# Altium schematic symbol library jlcpcb_2025_04_inductors_extended_0402.schlib: 1396 symbols (part 7 of 8) (continued)
## SDWL1005C82NJSTF
designator L?  Inductance: 82nH
Inductor, 82nH, ±5%, 1.9Ω, 140mA, SMD 0402; Manufacturer: Sunlord; Manufacturer Part Number: SDWL1005C82NJSTF; Package Size: 0402; JLCPCB Basic Part: No; JLCPCB Part Number: C54972; Supplier 1: LCSC; Category: Inductors; Supplier Part Number 1: C54972; Tolerance: ±5%; Rated Current: 140mA; DC Resistance: 1.9Ω; RoHS: Yes; ComponentLink1Description: Datasheet; ComponentLink1URL: https://wmsc.lcsc.com/wmsc/upload/file/pdf/v2/lcsc/2304140030_Sunlord-SDWL1005C82NJSTF_C54972.pdf; ComponentLink2Description: JLCPCB Part URL; ComponentLink2URL: https://jlcpcb.com/partdetail/C54972; ComponentLink3Description: LCSC Part URL; ComponentLink3URL: https://lcsc.com/product-detail/Inductors-SMD_Sunlord-Sunlord-SDWL1005C82NJSTF_C54972.html
footprint IND-0402 (0402 (1005M) Inductor)
pins: 1, 2

## SDWL1005C82NJSTFM01
designator L?  Inductance: 82nH
Inductor, 82nH, ±5%, 2.24Ω, 130mA, SMD 0402; Manufacturer: Sunlord; Manufacturer Part Number: SDWL1005C82NJSTFM01; Package Size: 0402; JLCPCB Basic Part: No; JLCPCB Part Number: C408710; Supplier 1: LCSC; Category: Inductors; Supplier Part Number 1: C408710; Tolerance: ±5%; Rated Current: 130mA; DC Resistance: 2.24Ω; RoHS: Yes; ComponentLink1Description: Datasheet; ComponentLink1URL: https://wmsc.lcsc.com/wmsc/upload/file/pdf/v2/lcsc/2304140030_Sunlord-SDWL1005C82NJSTFM01_C408710.pdf; ComponentLink2Description: JLCPCB Part URL; ComponentLink2URL: https://jlcpcb.com/partdetail/C408710; ComponentLink3Description: LCSC Part URL; ComponentLink3URL: https://lcsc.com/product-detail/Inductors-SMD_Sunlord-Sunlord-SDWL1005C82NJSTFM01_C408710.html
footprint IND-0402 (0402 (1005M) Inductor)
pins: 1, 2

## SDWL1005CHR10GSTF
designator L?  Inductance: 100nH
Inductor, 100nH, ±2%, 1.2Ω, 310mA, SMD 0402; Manufacturer: Sunlord; Manufacturer Part Number: SDWL1005CHR10GSTF; Package Size: 0402; JLCPCB Basic Part: No; JLCPCB Part Number: C370317; Supplier 1: LCSC; Category: Inductors; Supplier Part Number 1: C370317; Tolerance: ±2%; Rated Current: 310mA; DC Resistance: 1.2Ω; RoHS: Yes; ComponentLink1Description: Datasheet; ComponentLink1URL: https://wmsc.lcsc.com/wmsc/upload/file/pdf/v2/lcsc/2304140030_Sunlord-SDWL1005CHR10GSTF_C370317.pdf; ComponentLink2Description: JLCPCB Part URL; ComponentLink2URL: https://jlcpcb.com/partdetail/C370317; ComponentLink3Description: LCSC Part URL; ComponentLink3URL: https://lcsc.com/product-detail/Inductors-SMD_Sunlord-Sunlord-SDWL1005CHR10GSTF_C370317.html
footprint IND-0402 (0402 (1005M) Inductor)
pins: 1, 2

## SDWL1005CP3N6CSTF
designator L?  Inductance: 3.6nH
Inductor, 3.6nH, 45mΩ, 1.7A, SMD 0402; Manufacturer: Sunlord; Manufacturer Part Number: SDWL1005CP3N6CSTF; Package Size: 0402; JLCPCB Basic Part: No; JLCPCB Part Number: C370319; Supplier 1: LCSC; Category: Inductors; Supplier Part Number 1: C370319; Rated Current: 1.7A; DC Resistance: 45mΩ; RoHS: Yes; ComponentLink1Description: Datasheet; ComponentLink1URL: https://wmsc.lcsc.com/wmsc/upload/file/pdf/v2/lcsc/2304140030_Sunlord-SDWL1005CP3N6CSTF_C370319.pdf; ComponentLink2Description: JLCPCB Part URL; ComponentLink2URL: https://jlcpcb.com/partdetail/C370319; ComponentLink3Description: LCSC Part URL; ComponentLink3URL: https://lcsc.com/product-detail/Inductors-SMD_Sunlord-Sunlord-SDWL1005CP3N6CSTF_C370319.html
footprint IND-0402 (0402 (1005M) Inductor)
pins: 1, 2

## SDWL1005CP18NJSTF
designator L?  Inductance: 18nH
Inductor, 18nH, ±5%, 120mΩ, 900mA, SMD 0402; Manufacturer: Sunlord; Manufacturer Part Number: SDWL1005CP18NJSTF; Package Size: 0402; JLCPCB Basic Part: No; JLCPCB Part Number: C361613; Supplier 1: LCSC; Category: Inductors; Supplier Part Number 1: C361613; Tolerance: ±5%; Rated Current: 900mA; DC Resistance: 120mΩ; RoHS: Yes; ComponentLink1Description: Datasheet; ComponentLink1URL: https://wmsc.lcsc.com/wmsc/upload/file/pdf/v2/lcsc/2304140030_Sunlord-SDWL1005CP18NJSTF_C361613.pdf; ComponentLink2Description: JLCPCB Part URL; ComponentLink2URL: https://jlcpcb.com/partdetail/C361613; ComponentLink3Description: LCSC Part URL; ComponentLink3URL: https://lcsc.com/product-detail/Inductors-SMD_Sunlord-Sunlord-SDWL1005CP18NJSTF_C361613.html
footprint IND-0402 (0402 (1005M) Inductor)
pins: 1, 2

## SDWL1005CP33NJSTF
designator L?  Inductance: 33nH
Inductor, 33nH, ±5%, 330mΩ, 490mA, SMD 0402; Manufacturer: Sunlord; Manufacturer Part Number: SDWL1005CP33NJSTF; Package Size: 0402; JLCPCB Basic Part: No; JLCPCB Part Number: C361611; Supplier 1: LCSC; Category: Inductors; Supplier Part Number 1: C361611; Tolerance: ±5%; Rated Current: 490mA; DC Resistance: 330mΩ; RoHS: Yes; ComponentLink1Description: Datasheet; ComponentLink1URL: https://wmsc.lcsc.com/wmsc/upload/file/pdf/v2/lcsc/2304140030_Sunlord-SDWL1005CP33NJSTF_C361611.pdf; ComponentLink2Description: JLCPCB Part URL; ComponentLink2URL: https://jlcpcb.com/partdetail/C361611; ComponentLink3Description: LCSC Part URL; ComponentLink3URL: https://lcsc.com/product-detail/Inductors-SMD_Sunlord-Sunlord-SDWL1005CP33NJSTF_C361611.html
footprint IND-0402 (0402 (1005M) Inductor)
pins: 1, 2

## SDWL1005CP39NJSTF
designator L?  Inductance: 39nH
Inductor, 39nH, ±5%, 430mΩ, 450mA, SMD 0402; Manufacturer: Sunlord; Manufacturer Part Number: SDWL1005CP39NJSTF; Package Size: 0402; JLCPCB Basic Part: No; JLCPCB Part Number: C361610; Supplier 1: LCSC; Category: Inductors; Supplier Part Number 1: C361610; Tolerance: ±5%; Rated Current: 450mA; DC Resistance: 430mΩ; RoHS: Yes; ComponentLink1Description: Datasheet; ComponentLink1URL: https://wmsc.lcsc.com/wmsc/upload/file/pdf/v2/lcsc/2008271805_Sunlord-SDWL1005CP39NJSTF_C361610.pdf; ComponentLink2Description: JLCPCB Part URL; ComponentLink2URL: https://jlcpcb.com/partdetail/C361610; ComponentLink3Description: LCSC Part URL; ComponentLink3URL: https://lcsc.com/product-detail/Inductors-SMD_Sunlord-Sunlord-SDWL1005CP39NJSTF_C361610.html
footprint IND-0402 (0402 (1005M) Inductor)
pins: 1, 2

## SDWL1005CR10GSTF
designator L?  Inductance: 100nH
Inductor, 100nH, ±2%, 2.06Ω, 130mA, SMD 0402; Manufacturer: Sunlord; Manufacturer Part Number: SDWL1005CR10GSTF; Package Size: 0402; JLCPCB Basic Part: No; JLCPCB Part Number: C95949; Supplier 1: LCSC; Category: Inductors; Supplier Part Number 1: C95949; Tolerance: ±2%; Rated Current: 130mA; DC Resistance: 2.06Ω; RoHS: Yes; ComponentLink1Description: Datasheet; ComponentLink1URL: https://wmsc.lcsc.com/wmsc/upload/file/pdf/v2/lcsc/2304140030_Sunlord-SDWL1005CR10GSTF_C95949.pdf; ComponentLink2Description: JLCPCB Part URL; ComponentLink2URL: https://jlcpcb.com/partdetail/C95949; ComponentLink3Description: LCSC Part URL; ComponentLink3URL: https://lcsc.com/product-detail/Inductors-SMD_Sunlord-Sunlord-SDWL1005CR10GSTF_C95949.html
footprint IND-0402 (0402 (1005M) Inductor)
pins: 1, 2

## SDWL1005CR10JSTF
designator L?  Inductance: 100nH
Inductor, 100nH, ±5%, 2.06Ω, 130mA, SMD 0402; Manufacturer: Sunlord; Manufacturer Part Number: SDWL1005CR10JSTF; Package Size: 0402; JLCPCB Basic Part: No; JLCPCB Part Number: C54977; Supplier 1: LCSC; Category: Inductors; Supplier Part Number 1: C54977; Tolerance: ±5%; Rated Current: 130mA; DC Resistance: 2.06Ω; RoHS: Yes; ComponentLink1Description: Datasheet; ComponentLink1URL: https://wmsc.lcsc.com/wmsc/upload/file/pdf/v2/lcsc/2304140030_Sunlord-SDWL1005CR10JSTF_C54977.pdf; ComponentLink2Description: JLCPCB Part URL; ComponentLink2URL: https://jlcpcb.com/partdetail/C54977; ComponentLink3Description: LCSC Part URL; ComponentLink3URL: https://lcsc.com/product-detail/Inductors-SMD_Sunlord-Sunlord-SDWL1005CR10JSTF_C54977.html
footprint IND-0402 (0402 (1005M) Inductor)
pins: 1, 2

## SDWL1005CR12JSTFM01
designator L?  Inductance: 120nH
Inductor, 120nH, ±5%, 2.66Ω, 110mA, SMD 0402; Manufacturer: Sunlord; Manufacturer Part Number: SDWL1005CR12JSTFM01; Package Size: 0402; JLCPCB Basic Part: No; JLCPCB Part Number: C408712; Supplier 1: LCSC; Category: Inductors; Supplier Part Number 1: C408712; Tolerance: ±5%; Rated Current: 110mA; DC Resistance: 2.66Ω; RoHS: Yes; ComponentLink1Description: Datasheet; ComponentLink1URL: https://wmsc.lcsc.com/wmsc/upload/file/pdf/v2/lcsc/1912111437_Sunlord-SDWL1005CR12JSTFM01_C408712.pdf; ComponentLink2Description: JLCPCB Part URL; ComponentLink2URL: https://jlcpcb.com/partdetail/C408712; ComponentLink3Description: LCSC Part URL; ComponentLink3URL: https://lcsc.com/product-detail/Inductors-SMD_Sunlord-Sunlord-SDWL1005CR12JSTFM01_C408712.html
footprint IND-0402 (0402 (1005M) Inductor)
pins: 1, 2

## VHF100505H1N0ST
designator L?  Inductance: 1nH
Inductor, 1nH, 100mΩ, 400mA, SMD 0402; Manufacturer: FH (Guangdong Fenghua Advanced Tech); Manufacturer Part Number: VHF100505H1N0ST; Self-Resonant Frequency: 10GHz; Q Factor: 8@100MHz; Package Size: 0402; JLCPCB Basic Part: No; JLCPCB Part Number: C2840281; Supplier 1: LCSC; Category: Inductors; Supplier Part Number 1: C2840281; Rated Current: 400mA; DC Resistance: 100mΩ; RoHS: Yes; ComponentLink1Description: Datasheet; ComponentLink1URL: https://wmsc.lcsc.com/wmsc/upload/file/pdf/v2/lcsc/2202132000_FH--Guangdong-Fenghua-Advanced-Tech-VHF100505H1N0ST_C2840281.pdf; ComponentLink2Description: JLCPCB Part URL; ComponentLink2URL: https://jlcpcb.com/partdetail/C2840281; ComponentLink3Description: LCSC Part URL; ComponentLink3URL: https://lcsc.com/product-detail/Inductors-SMD_FH-Guangdong-Fenghua-Advanced-Tech-FH-Guangdong-Fenghua-Advanced-Tech-VHF100505H1N0ST_C2840281.html
footprint IND-0402 (0402 (1005M) Inductor)
pins: 1, 2

## VHF100505H1N1ST
designator L?  Inductance: 1.1nH
Inductor, 1.1nH, 400mΩ, 300mA, SMD 0402; Manufacturer: FH(Guangdong Fenghua Advanced Tech); Manufacturer Part Number: VHF100505H1N1ST; Package Size: 0402; JLCPCB Basic Part: No; JLCPCB Part Number: C381799; Supplier 1: LCSC; Category: Inductors; Supplier Part Number 1: C381799; Rated Current: 300mA; DC Resistance: 400mΩ; RoHS: Yes; ComponentLink1Description: Datasheet; ComponentLink1URL: https://wmsc.lcsc.com/wmsc/upload/file/pdf/v2/lcsc/2304140030_FH--Guangdong-Fenghua-Advanced-Tech-VHF100505H1N1ST_C381799.pdf; ComponentLink2Description: JLCPCB Part URL; ComponentLink2URL: https://jlcpcb.com/partdetail/C381799; ComponentLink3Description: LCSC Part URL; ComponentLink3URL: https://lcsc.com/product-detail/Inductors-SMD_FH-Guangdong-Fenghua-Advanced-Tech-FH-Guangdong-Fenghua-Advanced-Tech-VHF100505H1N1ST_C381799.html
footprint IND-0402 (0402 (1005M) Inductor)
pins: 1, 2

## VHF100505H1N2ST
designator L?  Inductance: 1.2nH
Inductor, 1.2nH, 170mΩ, 300mA, SMD 0402; Manufacturer: FH(Guangdong Fenghua Advanced Tech); Manufacturer Part Number: VHF100505H1N2ST; Package Size: 0402; JLCPCB Basic Part: No; JLCPCB Part Number: C90187; Supplier 1: LCSC; Category: Inductors; Supplier Part Number 1: C90187; Rated Current: 300mA; DC Resistance: 170mΩ; RoHS: Yes; ComponentLink1Description: Datasheet; ComponentLink1URL: https://wmsc.lcsc.com/wmsc/upload/file/pdf/v2/lcsc/2304140030_FH--Guangdong-Fenghua-Advanced-Tech-VHF100505H1N2ST_C90187.pdf; ComponentLink2Description: JLCPCB Part URL; ComponentLink2URL: https://jlcpcb.com/partdetail/C90187; ComponentLink3Description: LCSC Part URL; ComponentLink3URL: https://lcsc.com/product-detail/Inductors-SMD_FH-Guangdong-Fenghua-Advanced-Tech-FH-Guangdong-Fenghua-Advanced-Tech-VHF100505H1N2ST_C90187.html
footprint IND-0402 (0402 (1005M) Inductor)
pins: 1, 2

## VHF100505H1N3ST
designator L?  Inductance: 1.3nH
Inductor, 1.3nH, 400mΩ, 300mA, SMD 0402; Manufacturer: FH(Guangdong Fenghua Advanced Tech); Manufacturer Part Number: VHF100505H1N3ST; Package Size: 0402; JLCPCB Basic Part: No; JLCPCB Part Number: C381800; Supplier 1: LCSC; Category: Inductors; Supplier Part Number 1: C381800; Rated Current: 300mA; DC Resistance: 400mΩ; RoHS: Yes; ComponentLink1Description: Datasheet; ComponentLink1URL: https://wmsc.lcsc.com/wmsc/upload/file/pdf/v2/lcsc/2304140030_FH--Guangdong-Fenghua-Advanced-Tech-VHF100505H1N3ST_C381800.pdf; ComponentLink2Description: JLCPCB Part URL; ComponentLink2URL: https://jlcpcb.com/partdetail/C381800; ComponentLink3Description: LCSC Part URL; ComponentLink3URL: https://lcsc.com/product-detail/Inductors-SMD_FH-Guangdong-Fenghua-Advanced-Tech-FH-Guangdong-Fenghua-Advanced-Tech-VHF100505H1N3ST_C381800.html
footprint IND-0402 (0402 (1005M) Inductor)
pins: 1, 2

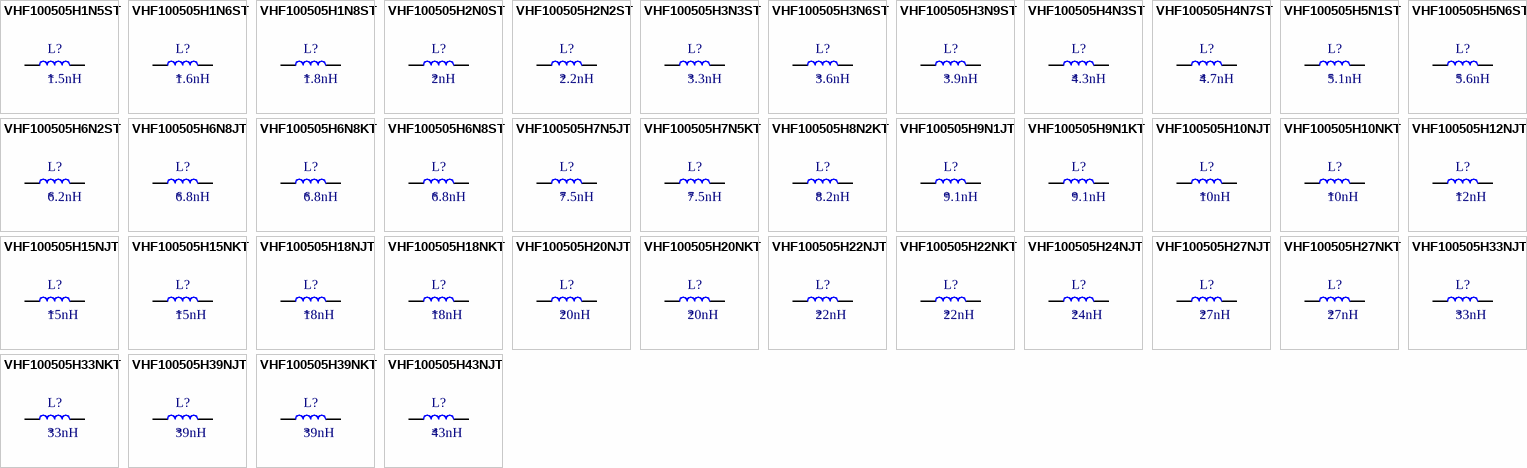
[diagram p32: symbols VHF100505H1N5ST to VHF100505H43NJT]

## VHF100505H1N5ST
designator L?  Inductance: 1.5nH
Inductor, 1.5nH, 180mΩ, 300mA, SMD 0402; Manufacturer: FH(Guangdong Fenghua Advanced Tech); Manufacturer Part Number: VHF100505H1N5ST; Package Size: 0402; JLCPCB Basic Part: No; JLCPCB Part Number: C90188; Supplier 1: LCSC; Category: Inductors; Supplier Part Number 1: C90188; Rated Current: 300mA; DC Resistance: 180mΩ; RoHS: Yes; ComponentLink1Description: Datasheet; ComponentLink1URL: https://wmsc.lcsc.com/wmsc/upload/file/pdf/v2/lcsc/2304140030_FH--Guangdong-Fenghua-Advanced-Tech-VHF100505H1N5ST_C90188.pdf; ComponentLink2Description: JLCPCB Part URL; ComponentLink2URL: https://jlcpcb.com/partdetail/C90188; ComponentLink3Description: LCSC Part URL; ComponentLink3URL: https://lcsc.com/product-detail/Inductors-SMD_FH-Guangdong-Fenghua-Advanced-Tech-FH-Guangdong-Fenghua-Advanced-Tech-VHF100505H1N5ST_C90188.html
footprint IND-0402 (0402 (1005M) Inductor)
pins: 1, 2

## VHF100505H1N6ST
designator L?  Inductance: 1.6nH
Inductor, 1.6nH, 400mΩ, 300mA, SMD 0402; Manufacturer: FH(Guangdong Fenghua Advanced Tech); Manufacturer Part Number: VHF100505H1N6ST; Package Size: 0402; JLCPCB Basic Part: No; JLCPCB Part Number: C381801; Supplier 1: LCSC; Category: Inductors; Supplier Part Number 1: C381801; Rated Current: 300mA; DC Resistance: 400mΩ; RoHS: Yes; ComponentLink1Description: Datasheet; ComponentLink1URL: https://wmsc.lcsc.com/wmsc/upload/file/pdf/v2/lcsc/2304140030_FH--Guangdong-Fenghua-Advanced-Tech-VHF100505H1N6ST_C381801.pdf; ComponentLink2Description: JLCPCB Part URL; ComponentLink2URL: https://jlcpcb.com/partdetail/C381801; ComponentLink3Description: LCSC Part URL; ComponentLink3URL: https://lcsc.com/product-detail/Inductors-SMD_FH-Guangdong-Fenghua-Advanced-Tech-FH-Guangdong-Fenghua-Advanced-Tech-VHF100505H1N6ST_C381801.html
footprint IND-0402 (0402 (1005M) Inductor)
pins: 1, 2

## VHF100505H1N8ST
designator L?  Inductance: 1.8nH
Inductor, 1.8nH, 190mΩ, 300mA, SMD 0402; Manufacturer: FH(Guangdong Fenghua Advanced Tech); Manufacturer Part Number: VHF100505H1N8ST; Package Size: 0402; JLCPCB Basic Part: No; JLCPCB Part Number: C90189; Supplier 1: LCSC; Category: Inductors; Supplier Part Number 1: C90189; Rated Current: 300mA; DC Resistance: 190mΩ; RoHS: Yes; ComponentLink1Description: Datasheet; ComponentLink1URL: https://wmsc.lcsc.com/wmsc/upload/file/pdf/v2/lcsc/2304140030_FH--Guangdong-Fenghua-Advanced-Tech-VHF100505H1N8ST_C90189.pdf; ComponentLink2Description: JLCPCB Part URL; ComponentLink2URL: https://jlcpcb.com/partdetail/C90189; ComponentLink3Description: LCSC Part URL; ComponentLink3URL: https://lcsc.com/product-detail/Inductors-SMD_FH-Guangdong-Fenghua-Advanced-Tech-FH-Guangdong-Fenghua-Advanced-Tech-VHF100505H1N8ST_C90189.html
footprint IND-0402 (0402 (1005M) Inductor)
pins: 1, 2

## VHF100505H2N0ST
designator L?  Inductance: 2nH
Inductor, 2nH, SMD 0402; Manufacturer: FH(Guangdong Fenghua Advanced Tech); Manufacturer Part Number: VHF100505H2N0ST; Package Size: 0402; JLCPCB Basic Part: No; JLCPCB Part Number: C90190; Supplier 1: LCSC; Category: Inductors; Supplier Part Number 1: C90190; RoHS: Yes; ComponentLink1Description: Datasheet; ComponentLink1URL: https://wmsc.lcsc.com/wmsc/upload/file/pdf/v2/lcsc/2304140030_FH--Guangdong-Fenghua-Advanced-Tech-VHF100505H2N0ST_C90190.pdf; ComponentLink2Description: JLCPCB Part URL; ComponentLink2URL: https://jlcpcb.com/partdetail/C90190; ComponentLink3Description: LCSC Part URL; ComponentLink3URL: https://lcsc.com/product-detail/Inductors-SMD_FH-Guangdong-Fenghua-Advanced-Tech-FH-Guangdong-Fenghua-Advanced-Tech-VHF100505H2N0ST_C90190.html
footprint IND-0402 (0402 (1005M) Inductor)
pins: 1, 2

## VHF100505H2N2ST
designator L?  Inductance: 2.2nH
Inductor, 2.2nH, 210mΩ, 300mA, SMD 0402; Manufacturer: FH(Guangdong Fenghua Advanced Tech); Manufacturer Part Number: VHF100505H2N2ST; Package Size: 0402; JLCPCB Basic Part: No; JLCPCB Part Number: C90191; Supplier 1: LCSC; Category: Inductors; Supplier Part Number 1: C90191; Rated Current: 300mA; DC Resistance: 210mΩ; RoHS: Yes; ComponentLink1Description: Datasheet; ComponentLink1URL: https://wmsc.lcsc.com/wmsc/upload/file/pdf/v2/lcsc/2304140030_FH--Guangdong-Fenghua-Advanced-Tech-VHF100505H2N2ST_C90191.pdf; ComponentLink2Description: JLCPCB Part URL; ComponentLink2URL: https://jlcpcb.com/partdetail/C90191; ComponentLink3Description: LCSC Part URL; ComponentLink3URL: https://lcsc.com/product-detail/Inductors-SMD_FH-Guangdong-Fenghua-Advanced-Tech-FH-Guangdong-Fenghua-Advanced-Tech-VHF100505H2N2ST_C90191.html
footprint IND-0402 (0402 (1005M) Inductor)
pins: 1, 2

## VHF100505H3N3ST
designator L?  Inductance: 3.3nH
Inductor, 3.3nH, 250mΩ, 300mA, SMD 0402; Manufacturer: FH(Guangdong Fenghua Advanced Tech); Manufacturer Part Number: VHF100505H3N3ST; Package Size: 0402; JLCPCB Basic Part: No; JLCPCB Part Number: C90193; Supplier 1: LCSC; Category: Inductors; Supplier Part Number 1: C90193; Rated Current: 300mA; DC Resistance: 250mΩ; RoHS: Yes; ComponentLink1Description: Datasheet; ComponentLink1URL: https://wmsc.lcsc.com/wmsc/upload/file/pdf/v2/lcsc/2304140030_FH--Guangdong-Fenghua-Advanced-Tech-VHF100505H3N3ST_C90193.pdf; ComponentLink2Description: JLCPCB Part URL; ComponentLink2URL: https://jlcpcb.com/partdetail/C90193; ComponentLink3Description: LCSC Part URL; ComponentLink3URL: https://lcsc.com/product-detail/Inductors-SMD_FH-Guangdong-Fenghua-Advanced-Tech-FH-Guangdong-Fenghua-Advanced-Tech-VHF100505H3N3ST_C90193.html
footprint IND-0402 (0402 (1005M) Inductor)
pins: 1, 2

## VHF100505H3N6ST
designator L?  Inductance: 3.6nH
Inductor, 3.6nH, SMD 0402; Manufacturer: FH(Guangdong Fenghua Advanced Tech); Manufacturer Part Number: VHF100505H3N6ST; Package Size: 0402; JLCPCB Basic Part: No; JLCPCB Part Number: C90195; Supplier 1: LCSC; Category: Inductors; Supplier Part Number 1: C90195; RoHS: Yes; ComponentLink1Description: Datasheet; ComponentLink1URL: https://wmsc.lcsc.com/wmsc/upload/file/pdf/v2/lcsc/2304140030_FH--Guangdong-Fenghua-Advanced-Tech-VHF100505H3N6ST_C90195.pdf; ComponentLink2Description: JLCPCB Part URL; ComponentLink2URL: https://jlcpcb.com/partdetail/C90195; ComponentLink3Description: LCSC Part URL; ComponentLink3URL: https://lcsc.com/product-detail/Inductors-SMD_FH-Guangdong-Fenghua-Advanced-Tech-FH-Guangdong-Fenghua-Advanced-Tech-VHF100505H3N6ST_C90195.html
footprint IND-0402 (0402 (1005M) Inductor)
pins: 1, 2

## VHF100505H3N9ST
designator L?  Inductance: 3.9nH
Inductor, 3.9nH, 200mΩ, 300mA, SMD 0402; Manufacturer: FH (Guangdong Fenghua Advanced Tech); Manufacturer Part Number: VHF100505H3N9ST; Self-Resonant Frequency: 4GHz; Q Factor: 8@100MHz; Package Size: 0402; JLCPCB Basic Part: No; JLCPCB Part Number: C962248; Supplier 1: LCSC; Category: Inductors; Supplier Part Number 1: C962248; Rated Current: 300mA; DC Resistance: 200mΩ; RoHS: Yes; ComponentLink1Description: Datasheet; ComponentLink1URL: https://wmsc.lcsc.com/wmsc/upload/file/pdf/v2/lcsc/2304140030_FH--Guangdong-Fenghua-Advanced-Tech-VHF100505H3N9ST_C962248.pdf; ComponentLink2Description: JLCPCB Part URL; ComponentLink2URL: https://jlcpcb.com/partdetail/C962248; ComponentLink3Description: LCSC Part URL; ComponentLink3URL: https://lcsc.com/product-detail/Inductors-SMD_FH-Guangdong-Fenghua-Advanced-Tech-FH-Guangdong-Fenghua-Advanced-Tech-VHF100505H3N9ST_C962248.html
footprint IND-0402 (0402 (1005M) Inductor)
pins: 1, 2

## VHF100505H4N3ST
designator L?  Inductance: 4.3nH
Inductor, 4.3nH, SMD 0402; Manufacturer: FH(Guangdong Fenghua Advanced Tech); Manufacturer Part Number: VHF100505H4N3ST; Package Size: 0402; JLCPCB Basic Part: No; JLCPCB Part Number: C90197; Supplier 1: LCSC; Category: Inductors; Supplier Part Number 1: C90197; RoHS: Yes; ComponentLink1Description: Datasheet; ComponentLink1URL: https://wmsc.lcsc.com/wmsc/upload/file/pdf/v2/lcsc/2304140030_FH--Guangdong-Fenghua-Advanced-Tech-VHF100505H4N3ST_C90197.pdf; ComponentLink2Description: JLCPCB Part URL; ComponentLink2URL: https://jlcpcb.com/partdetail/C90197; ComponentLink3Description: LCSC Part URL; ComponentLink3URL: https://lcsc.com/product-detail/Inductors-SMD_FH-Guangdong-Fenghua-Advanced-Tech-FH-Guangdong-Fenghua-Advanced-Tech-VHF100505H4N3ST_C90197.html
footprint IND-0402 (0402 (1005M) Inductor)
pins: 1, 2

## VHF100505H4N7ST
designator L?  Inductance: 4.7nH
Inductor, 4.7nH, 300mΩ, 300mA, SMD 0402; Manufacturer: FH(Guangdong Fenghua Advanced Tech); Manufacturer Part Number: VHF100505H4N7ST; Package Size: 0402; JLCPCB Basic Part: No; JLCPCB Part Number: C90198; Supplier 1: LCSC; Category: Inductors; Supplier Part Number 1: C90198; Rated Current: 300mA; DC Resistance: 300mΩ; RoHS: Yes; ComponentLink1Description: Datasheet; ComponentLink1URL: https://wmsc.lcsc.com/wmsc/upload/file/pdf/v2/lcsc/2304140030_FH--Guangdong-Fenghua-Advanced-Tech-VHF100505H4N7ST_C90198.pdf; ComponentLink2Description: JLCPCB Part URL; ComponentLink2URL: https://jlcpcb.com/partdetail/C90198; ComponentLink3Description: LCSC Part URL; ComponentLink3URL: https://lcsc.com/product-detail/Inductors-SMD_FH-Guangdong-Fenghua-Advanced-Tech-FH-Guangdong-Fenghua-Advanced-Tech-VHF100505H4N7ST_C90198.html
footprint IND-0402 (0402 (1005M) Inductor)
pins: 1, 2

## VHF100505H5N1ST
designator L?  Inductance: 5.1nH
Inductor, 5.1nH, SMD 0402; Manufacturer: FH(Guangdong Fenghua Advanced Tech); Manufacturer Part Number: VHF100505H5N1ST; Package Size: 0402; JLCPCB Basic Part: No; JLCPCB Part Number: C90133; Supplier 1: LCSC; Category: Inductors; Supplier Part Number 1: C90133; RoHS: Yes; ComponentLink1Description: Datasheet; ComponentLink1URL: https://wmsc.lcsc.com/wmsc/upload/file/pdf/v2/lcsc/2304140030_FH--Guangdong-Fenghua-Advanced-Tech-VHF100505H5N1ST_C90133.pdf; ComponentLink2Description: JLCPCB Part URL; ComponentLink2URL: https://jlcpcb.com/partdetail/C90133; ComponentLink3Description: LCSC Part URL; ComponentLink3URL: https://lcsc.com/product-detail/Inductors-SMD_FH-Guangdong-Fenghua-Advanced-Tech-FH-Guangdong-Fenghua-Advanced-Tech-VHF100505H5N1ST_C90133.html
footprint IND-0402 (0402 (1005M) Inductor)
pins: 1, 2

## VHF100505H5N6ST
designator L?  Inductance: 5.6nH
Inductor, 5.6nH, 300mΩ, 300mA, SMD 0402; Manufacturer: FH(Guangdong Fenghua Advanced Tech); Manufacturer Part Number: VHF100505H5N6ST; Package Size: 0402; JLCPCB Basic Part: No; JLCPCB Part Number: C139268; Supplier 1: LCSC; Category: Inductors; Supplier Part Number 1: C139268; Rated Current: 300mA; DC Resistance: 300mΩ; RoHS: Yes; ComponentLink1Description: Datasheet; ComponentLink1URL: https://wmsc.lcsc.com/wmsc/upload/file/pdf/v2/lcsc/2304140030_FH--Guangdong-Fenghua-Advanced-Tech-VHF100505H5N6ST_C139268.pdf; ComponentLink2Description: JLCPCB Part URL; ComponentLink2URL: https://jlcpcb.com/partdetail/C139268; ComponentLink3Description: LCSC Part URL; ComponentLink3URL: https://lcsc.com/product-detail/Inductors-SMD_FH-Guangdong-Fenghua-Advanced-Tech-FH-Guangdong-Fenghua-Advanced-Tech-VHF100505H5N6ST_C139268.html
footprint IND-0402 (0402 (1005M) Inductor)
pins: 1, 2

## VHF100505H6N2ST
designator L?  Inductance: 6.2nH
Inductor, 6.2nH, SMD 0402; Manufacturer: FH(Guangdong Fenghua Advanced Tech); Manufacturer Part Number: VHF100505H6N2ST; Package Size: 0402; JLCPCB Basic Part: No; JLCPCB Part Number: C90135; Supplier 1: LCSC; Category: Inductors; Supplier Part Number 1: C90135; RoHS: Yes; ComponentLink1Description: Datasheet; ComponentLink1URL: https://wmsc.lcsc.com/wmsc/upload/file/pdf/v2/lcsc/2304140030_FH--Guangdong-Fenghua-Advanced-Tech-VHF100505H6N2ST_C90135.pdf; ComponentLink2Description: JLCPCB Part URL; ComponentLink2URL: https://jlcpcb.com/partdetail/C90135; ComponentLink3Description: LCSC Part URL; ComponentLink3URL: https://lcsc.com/product-detail/Inductors-SMD_FH-Guangdong-Fenghua-Advanced-Tech-FH-Guangdong-Fenghua-Advanced-Tech-VHF100505H6N2ST_C90135.html
footprint IND-0402 (0402 (1005M) Inductor)
pins: 1, 2

## VHF100505H6N8JT
designator L?  Inductance: 6.8nH
Inductor, 6.8nH, ±5%, 370mΩ, 250mA, SMD 0402; Manufacturer: FH(Guangdong Fenghua Advanced Tech); Manufacturer Part Number: VHF100505H6N8JT; Package Size: 0402; JLCPCB Basic Part: No; JLCPCB Part Number: C90136; Supplier 1: LCSC; Category: Inductors; Supplier Part Number 1: C90136; Tolerance: ±5%; Rated Current: 250mA; DC Resistance: 370mΩ; RoHS: Yes; ComponentLink1Description: Datasheet; ComponentLink1URL: https://wmsc.lcsc.com/wmsc/upload/file/pdf/v2/lcsc/2304140030_FH--Guangdong-Fenghua-Advanced-Tech-VHF100505H6N8JT_C90136.pdf; ComponentLink2Description: JLCPCB Part URL; ComponentLink2URL: https://jlcpcb.com/partdetail/C90136; ComponentLink3Description: LCSC Part URL; ComponentLink3URL: https://lcsc.com/product-detail/Inductors-SMD_FH-Guangdong-Fenghua-Advanced-Tech-FH-Guangdong-Fenghua-Advanced-Tech-VHF100505H6N8JT_C90136.html
footprint IND-0402 (0402 (1005M) Inductor)
pins: 1, 2

## VHF100505H6N8KT
designator L?  Inductance: 6.8nH
Inductor, 6.8nH, ±10%, 200mΩ, 300mA, SMD 0402; Manufacturer: FH(Guangdong Fenghua Advanced Tech); Manufacturer Part Number: VHF100505H6N8KT; Package Size: 0402; JLCPCB Basic Part: No; JLCPCB Part Number: C381874; Supplier 1: LCSC; Category: Inductors; Supplier Part Number 1: C381874; Tolerance: ±10%; Rated Current: 300mA; DC Resistance: 200mΩ; RoHS: Yes; ComponentLink1Description: Datasheet; ComponentLink1URL: https://wmsc.lcsc.com/wmsc/upload/file/pdf/v2/lcsc/2304140030_FH--Guangdong-Fenghua-Advanced-Tech-VHF100505H6N8KT_C381874.pdf; ComponentLink2Description: JLCPCB Part URL; ComponentLink2URL: https://jlcpcb.com/partdetail/C381874; ComponentLink3Description: LCSC Part URL; ComponentLink3URL: https://lcsc.com/product-detail/Inductors-SMD_FH-Guangdong-Fenghua-Advanced-Tech-FH-Guangdong-Fenghua-Advanced-Tech-VHF100505H6N8KT_C381874.html
footprint IND-0402 (0402 (1005M) Inductor)
pins: 1, 2

## VHF100505H6N8ST
designator L?  Inductance: 6.8nH
Inductor, 6.8nH, SMD 0402; Manufacturer: FH(Guangdong Fenghua Advanced Tech); Manufacturer Part Number: VHF100505H6N8ST; Package Size: 0402; JLCPCB Basic Part: No; JLCPCB Part Number: C139269; Supplier 1: LCSC; Category: Inductors; Supplier Part Number 1: C139269; RoHS: Yes; ComponentLink1Description: Datasheet; ComponentLink1URL: https://wmsc.lcsc.com/wmsc/upload/file/pdf/v2/lcsc/2304140030_FH--Guangdong-Fenghua-Advanced-Tech-VHF100505H6N8ST_C139269.pdf; ComponentLink2Description: JLCPCB Part URL; ComponentLink2URL: https://jlcpcb.com/partdetail/C139269; ComponentLink3Description: LCSC Part URL; ComponentLink3URL: https://lcsc.com/product-detail/Inductors-SMD_FH-Guangdong-Fenghua-Advanced-Tech-FH-Guangdong-Fenghua-Advanced-Tech-VHF100505H6N8ST_C139269.html
footprint IND-0402 (0402 (1005M) Inductor)
pins: 1, 2

## VHF100505H7N5JT
designator L?  Inductance: 7.5nH
Inductor, 7.5nH, ±5%, SMD 0402; Manufacturer: FH(Guangdong Fenghua Advanced Tech); Manufacturer Part Number: VHF100505H7N5JT; Package Size: 0402; JLCPCB Basic Part: No; JLCPCB Part Number: C90137; Supplier 1: LCSC; Category: Inductors; Supplier Part Number 1: C90137; Tolerance: ±5%; RoHS: Yes; ComponentLink1Description: Datasheet; ComponentLink1URL: https://wmsc.lcsc.com/wmsc/upload/file/pdf/v2/lcsc/2304140030_FH--Guangdong-Fenghua-Advanced-Tech-VHF100505H7N5JT_C90137.pdf; ComponentLink2Description: JLCPCB Part URL; ComponentLink2URL: https://jlcpcb.com/partdetail/C90137; ComponentLink3Description: LCSC Part URL; ComponentLink3URL: https://lcsc.com/product-detail/Inductors-SMD_FH-Guangdong-Fenghua-Advanced-Tech-FH-Guangdong-Fenghua-Advanced-Tech-VHF100505H7N5JT_C90137.html
footprint IND-0402 (0402 (1005M) Inductor)
pins: 1, 2

## VHF100505H7N5KT
designator L?  Inductance: 7.5nH
Inductor, 7.5nH, ±10%, 800mΩ, 200mA, SMD 0402; Manufacturer: FH(Guangdong Fenghua Advanced Tech); Manufacturer Part Number: VHF100505H7N5KT; Package Size: 0402; JLCPCB Basic Part: No; JLCPCB Part Number: C381875; Supplier 1: LCSC; Category: Inductors; Supplier Part Number 1: C381875; Tolerance: ±10%; Rated Current: 200mA; DC Resistance: 800mΩ; RoHS: Yes; ComponentLink1Description: Datasheet; ComponentLink1URL: https://wmsc.lcsc.com/wmsc/upload/file/pdf/v2/lcsc/2304140030_FH--Guangdong-Fenghua-Advanced-Tech-VHF100505H7N5KT_C381875.pdf; ComponentLink2Description: JLCPCB Part URL; ComponentLink2URL: https://jlcpcb.com/partdetail/C381875; ComponentLink3Description: LCSC Part URL; ComponentLink3URL: https://lcsc.com/product-detail/Inductors-SMD_FH-Guangdong-Fenghua-Advanced-Tech-FH-Guangdong-Fenghua-Advanced-Tech-VHF100505H7N5KT_C381875.html
footprint IND-0402 (0402 (1005M) Inductor)
pins: 1, 2

## VHF100505H8N2KT
designator L?  Inductance: 8.2nH
Inductor, 8.2nH, ±10%, 200mΩ, 300mA, SMD 0402; Manufacturer: FH(Guangdong Fenghua Advanced Tech); Manufacturer Part Number: VHF100505H8N2KT; Package Size: 0402; JLCPCB Basic Part: No; JLCPCB Part Number: C381876; Supplier 1: LCSC; Category: Inductors; Supplier Part Number 1: C381876; Tolerance: ±10%; Rated Current: 300mA; DC Resistance: 200mΩ; RoHS: Yes; ComponentLink1Description: Datasheet; ComponentLink1URL: https://wmsc.lcsc.com/wmsc/upload/file/pdf/v2/lcsc/2304140030_FH--Guangdong-Fenghua-Advanced-Tech-VHF100505H8N2KT_C381876.pdf; ComponentLink2Description: JLCPCB Part URL; ComponentLink2URL: https://jlcpcb.com/partdetail/C381876; ComponentLink3Description: LCSC Part URL; ComponentLink3URL: https://lcsc.com/product-detail/Inductors-SMD_FH-Guangdong-Fenghua-Advanced-Tech-FH-Guangdong-Fenghua-Advanced-Tech-VHF100505H8N2KT_C381876.html
footprint IND-0402 (0402 (1005M) Inductor)
pins: 1, 2

## VHF100505H9N1JT
designator L?  Inductance: 9.1nH
Inductor, 9.1nH, ±5%, SMD 0402; Manufacturer: FH(Guangdong Fenghua Advanced Tech); Manufacturer Part Number: VHF100505H9N1JT; Package Size: 0402; JLCPCB Basic Part: No; JLCPCB Part Number: C90139; Supplier 1: LCSC; Category: Inductors; Supplier Part Number 1: C90139; Tolerance: ±5%; RoHS: Yes; ComponentLink1Description: Datasheet; ComponentLink1URL: https://wmsc.lcsc.com/wmsc/upload/file/pdf/v2/lcsc/2304140030_FH--Guangdong-Fenghua-Advanced-Tech-VHF100505H9N1JT_C90139.pdf; ComponentLink2Description: JLCPCB Part URL; ComponentLink2URL: https://jlcpcb.com/partdetail/C90139; ComponentLink3Description: LCSC Part URL; ComponentLink3URL: https://lcsc.com/product-detail/Inductors-SMD_FH-Guangdong-Fenghua-Advanced-Tech-FH-Guangdong-Fenghua-Advanced-Tech-VHF100505H9N1JT_C90139.html
footprint IND-0402 (0402 (1005M) Inductor)
pins: 1, 2

## VHF100505H9N1KT
designator L?  Inductance: 9.1nH
Inductor, 9.1nH, ±10%, 1Ω, 200mA, SMD 0402; Manufacturer: FH(Guangdong Fenghua Advanced Tech); Manufacturer Part Number: VHF100505H9N1KT; Package Size: 0402; JLCPCB Basic Part: No; JLCPCB Part Number: C381877; Supplier 1: LCSC; Category: Inductors; Supplier Part Number 1: C381877; Tolerance: ±10%; Rated Current: 200mA; DC Resistance: 1Ω; RoHS: Yes; ComponentLink1Description: Datasheet; ComponentLink1URL: https://wmsc.lcsc.com/wmsc/upload/file/pdf/v2/lcsc/2304140030_FH--Guangdong-Fenghua-Advanced-Tech-VHF100505H9N1KT_C381877.pdf; ComponentLink2Description: JLCPCB Part URL; ComponentLink2URL: https://jlcpcb.com/partdetail/C381877; ComponentLink3Description: LCSC Part URL; ComponentLink3URL: https://lcsc.com/product-detail/Inductors-SMD_FH-Guangdong-Fenghua-Advanced-Tech-FH-Guangdong-Fenghua-Advanced-Tech-VHF100505H9N1KT_C381877.html
footprint IND-0402 (0402 (1005M) Inductor)
pins: 1, 2
